# Altium footprint library Mi Libreria.PcbLib: 184 footprints (part 9 of 12)
Each footprint in its own frame and in the unit in brackets; x right, y up, seen from the top. Pads: shape width x height; smd on the part's side, far side on the other; paste and mask are expansions set on the pad; w line width, h text height; cw(c..) or ccw(c..) is an arc to the next point about the centre after c.
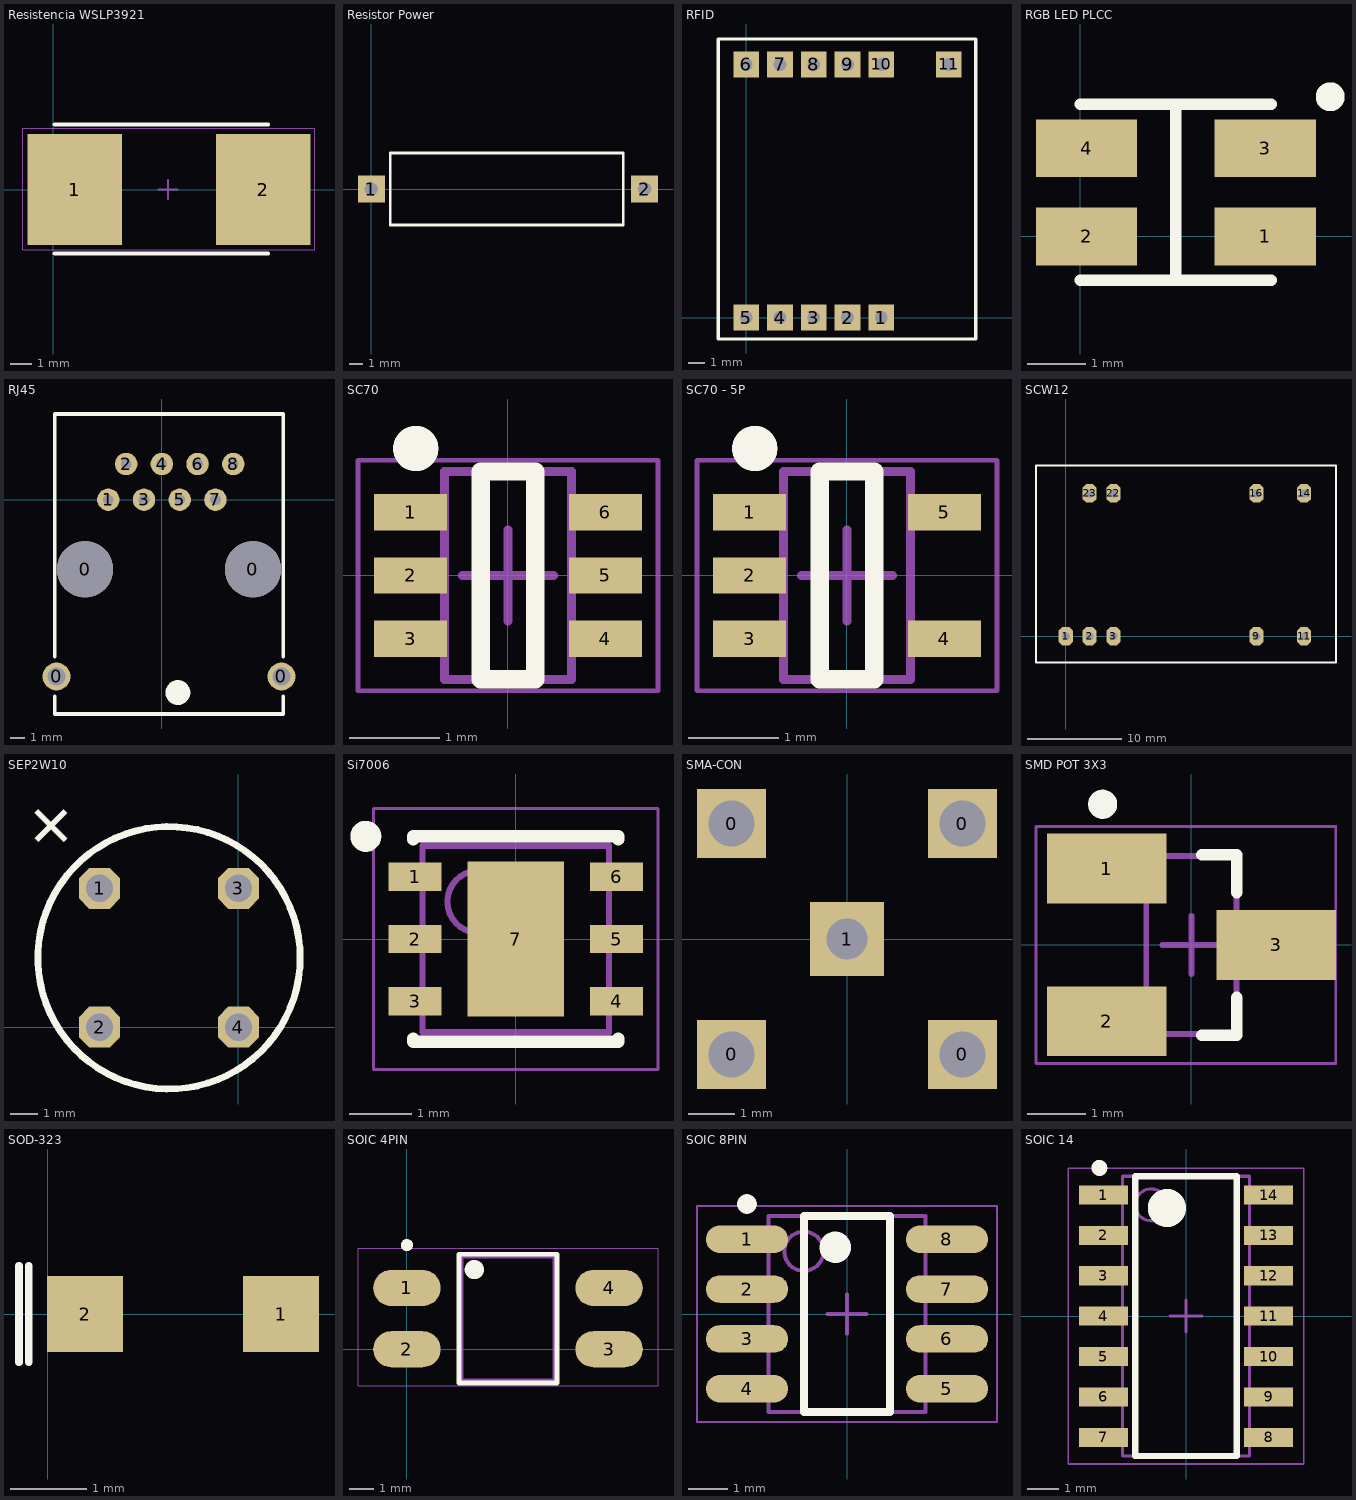
[diagram p8: the footprints below, top view; thin cyan lines are the x and y axes]

## Resistencia WSLP3921 [mm] "SMW510RJT WSLP39213L000FEB"
pads (2):
  rect 4.5x5.3 smd: 1(1.016,0) 2(10,0)
Top Overlay:
  lines w0.2: 0.064,-3.048 10.223,-3.048 ; 0.068,3.102 10.228,3.102
Mechanical 15:
  lines w0.05: -1.46,-2.857 -1.46,2.921 12.446,2.921 12.446,-2.857 -1.46,-2.857
  lines w0.1: 5.011,0 5.911,0 ; 5.461,-0.45 5.461,0.45
3D body "WSLP3921 (0.001).step": height 0.88, standoff 0, extent 0.461,-2.603 10.461,2.596

## Resistor Power [mm] "R 3W 0.6 In."
pads (2):
  rect 2x2 hole 1: 1(0,0) 2(20.25,0)
Top Overlay:
  lines w0.2: 1.397,-2.667 1.397,2.667 18.669,2.667 18.669,-2.667 1.397,-2.667
3D body "3wResistor.STEP": height 5.5, standoff -3.58, extent -0.508,-2.5 20.612,2.5

## RFID [mil] "RFID INNOVATIONS"
pads (11):
  rect 60x60 hole 30: 1(314.96,0) 2(236.22,0) 3(157.48,0) 4(78.74,0) 5(0,0) 6(0,590.55) 7(78.74,590.55) 8(157.48,590.55) 9(236.22,590.55) 10(314.96,590.55) 11(472.44,590.55)
Top Overlay:
  lines w7.87: -65,-50 -65,650 535,650 535,-50 -65,-50
3D body: height 196.85, standoff 78.74, extent -55,-40 525,640

## RGB LED PLCC [mm] "LEd RGB Plcc"
pads (4):
  rect 1.75x1 smd: 1(3.195,0) 2(0.107,0) 3(3.195,1.524) 4(0.107,1.524)
Top Overlay:
  circle w0.3: c4.318,2.413 r0.1
  lines w0.2: 0,-0.762 3.302,-0.762 ; 0,2.286 3.302,2.286 ; 1.651,-0.762 1.651,2.286
3D body "Osram Led PLCC4.step": height 1.95, standoff 0, extent -0.099,-0.638 3.401,2.162

## RJ45 [mm] "Conector"
pads (12):
  round 2 hole 1.25: 0(-7.493,-12.573) 0(8.509,-12.573)
  round 4 hole 4: 0(-5.461,-4.953) 0(6.477,-4.953)
  round 1.6 hole 0.762: 1(-3.81,0) 2(-2.54,2.54) 3(-1.27,0) 4(0,2.54) 5(1.27,0) 6(2.54,2.54) 7(3.81,0) 8(5.08,2.54)
Top Overlay:
  circle w1: c1.143,-13.716 r0.381
  lines w0.254: -7.62,-13.97 -7.62,-15.24 8.636,-15.24 8.636,-13.97 ; -7.62,-11.176 -7.62,6.096 8.636,6.096 8.636,-11.176

## SC70 [mm] "6 Pin SMD SC70"
height 1.1
pads (6):
  rect 0.8x0.4 smd: 1(-1.073,0.696) 2(-1.073,0) 3(-1.073,-0.696) 4(1.073,-0.696) 5(1.073,0) 6(1.073,0.696)
Top Overlay:
  circle w0.25: c-1.016,1.397 r0.125
  lines w0.2: -0.3,-1.143 -0.3,1.143 0.3,1.143 0.3,-1.143 -0.3,-1.143
Mechanical 13:
  lines w0.1: -0.7,-1.143 0.7,-1.143 0.7,1.143 -0.7,1.143 -0.7,-1.143
Mechanical 15:
  lines w0.05: -1.651,-1.27 1.651,-1.27 1.651,1.27 -1.651,1.27 -1.651,-1.27
  lines w0.1: -0.5,0 0.5,0 ; 0,-0.5 0,0.5
3D body "SC70-6.step": height 0.92, standoff -0.03, extent -1.05,-1 1.05,1

## SC70 - 5P [mm] "5 Pin SMD SC70"
height 1.1
pads (5):
  rect 0.8x0.4 smd: 1(-1.073,0.696) 2(-1.073,0) 3(-1.073,-0.696) 4(1.073,-0.696) 5(1.073,0.696)
Top Overlay:
  circle w0.25: c-1.016,1.397 r0.125
  lines w0.2: -0.3,-1.143 0.3,-1.143 0.3,1.143 -0.3,1.143 -0.3,-1.143
Mechanical 13:
  lines w0.1: -0.7,-1.143 -0.7,1.143 0.7,1.143 0.7,-1.143 -0.7,-1.143
Mechanical 15:
  lines w0.05: -1.651,-1.27 -1.651,1.27 1.651,1.27 1.651,-1.27 -1.651,-1.27
  lines w0.1: -0.5,0 0.5,0 ; 0,-0.5 0,0.5
3D body "SC70-5.step": height 1, standoff 0, extent -1.15,-1.05 1.15,1.05

## SCW12 [mm] "DC-DC CONVERTER"
pads (9):
  oct 1.5x2 hole 0.85: 1(0,0) 2(2.54,0) 3(5.08,0) 9(20.34,0) 11(25.42,0) 14(25.42,15.24) 16(20.34,15.24) 22(5.08,15.24) 23(2.54,15.24)
Top Overlay:
  lines w0.2: -3.175,-2.794 28.825,-2.794 28.825,18.206 -3.175,18.206 -3.175,-2.794
3D body: height 15, standoff 0.5, extent -3.048,-2.603 28.575,18.034
3D body: height 3, standoff -2, extent -0.299,-0.367 0.298,0.231
3D body: height 3, standoff -2, extent 2.243,-0.299 2.84,0.3
3D body: height 3, standoff -2, extent 4.783,-0.299 5.38,0.3
3D body: height 3, standoff -2, extent 2.243,14.941 2.84,15.54
3D body: height 3, standoff -2, extent 4.783,14.941 5.38,15.54
3D body: height 3, standoff -2, extent 25.123,-0.299 25.72,0.3
3D body: height 3, standoff -2, extent 20.043,-0.299 20.64,0.3
3D body: height 3, standoff -2, extent 20.043,14.941 20.64,15.54
3D body: height 3, standoff -2, extent 25.123,14.941 25.72,15.54

## SEP2W10 [mm] "Bridge Rectifier"
pads (4):
  oct 1.5x1.5 hole 1: 1(-5.08,5.08) 2(-5.08,0) 3(0,5.08) 4(0,0)
Top Overlay:
  circle w0.254: c-2.54,2.54 r4.8
  text "+" at -6.604,5.715 h3
3D body "SEP2W10.step": height 6.6, standoff -2.5, extent -7.19,-2.11 2.11,7.19

## Si7006 [mm] "Sensor I2C Humedad Temp"
height 1
pads (7):
  rect 0.85x0.455 smd: 1(-1.62,1) 2(-1.62,0) 3(-1.62,-1) 4(1.62,-1) 5(1.62,0) 6(1.62,1)
  rect 1.55x2.5 smd: 7(0,0)
Top Overlay:
  circle w0.25: c-2.413,1.651 r0.125
  lines w0.2: -1.65,-1.6 -1.65,-1.65 1.65,-1.65 1.65,-1.6 ; -1.65,1.6 -1.65,1.65 1.65,1.65 1.65,1.6
Mechanical 13:
  circle w0.1: c-0.6,0.6 r0.5
  lines w0.1: -1.5,-1.5 1.5,-1.5 1.5,1.5 -1.5,1.5 -1.5,-1.5
Mechanical 15:
  lines w0.05: -2.286,-2.1 2.286,-2.1 2.286,2.1 -2.286,2.1 -2.286,-2.1
  lines w0.1: -0.5,0 0.5,0 ; 0,-0.5 0,0.5
3D body: height 1, standoff 0.01, extent -1.5,-1.5 1.5,1.5

## SMA-CON [mm] "ANTENA"
pads (5):
  rect 1.5x1.5 hole 1 square: 0(-2.504,-2.504) 0(-2.504,2.504) 0(2.504,-2.504) 0(2.504,2.504)
  rect 1.6x1.6 hole 0.9: 1(0,0)
3D body "SMA CON.STEP": height 9.6, standoff -3.87, extent -3.175,-3.175 3.175,3.175

## SMD POT 3X3 [mm] "POTENCIOMETRO SMD 3X3mm"
height 1.45
pads (3):
  rect 2.05x1.2 smd: 1(-1.454,1.308) 2(-1.454,-1.308) 3(1.454,0)
Top Overlay:
  circle w0.25: c-1.524,2.413 r0.125
  lines w0.2: 0.175,-1.55 0.775,-1.55 0.775,-0.9 ; 0.175,1.55 0.775,1.55 0.775,0.9
Mechanical 13:
  lines w0.1: -0.775,-1.525 0.775,-1.525 0.775,1.525 -0.775,1.525 -0.775,-1.525
Mechanical 15:
  lines w0.05: -2.667,-2.032 2.475,-2.032 2.475,2.032 -2.667,2.032 -2.667,-2.032
  lines w0.1: -0.5,0 0.5,0 ; 0,-0.5 0,0.5
3D body "POT3X3.stp": height 1.01, standoff -0.06, extent -2.103,-1.9 2.127,1.9

## SOD-323 [mm] "SO3-323 SMD"
pads (2):
  rect 1x1 smd: 1(3.068,0) 2(0.488,0)
Top Overlay:
  lines w0.1: -0.381,-0.635 -0.381,0.635 ; -0.254,-0.635 -0.254,0.635
3D body "SOD-323.STEP": height 1.1, standoff 0, extent 0.478,-0.675 3.078,0.675

## SOIC 4PIN [mm] "SOIC, 4-Leads, Body 5.00x4.00mm, Pitch 1.27mm, IPC Medium Density"
height 2
pads (4):
  oval 2.8x1.5 smd: 1(0,2.54) 2(0,0) 3(8.382,0) 4(8.382,2.54)
Top Overlay:
  circle w0.4: c2.794,3.302 r0.2
  circle w0.25: c0,4.318 r0.125
  lines w0.2: 2.159,-1.397 6.223,-1.397 6.223,3.937 2.159,3.937 2.159,-1.397
Mechanical 13:
  lines w0.1: 2.286,-1.27 6.096,-1.27 6.096,3.81 2.286,3.81 2.286,-1.27
Mechanical 15:
  lines w0.05: -2.032,-1.524 10.414,-1.524 10.414,4.191 -2.032,4.191 -2.032,-1.524
  lines w0.1: -0.5,0 0.5,0 ; 0,-0.5 0,0.5
3D body "SOP 4.step": height 3.85, standoff 0.03, extent -0.736,-1.02 9.144,3.56

## SOIC 8PIN [mm] "SOIC, 8-Leads, Body 5.00x4.00mm, Pitch 1.27mm, IPC Medium Density"
height 2
pads (8):
  oval 2.1x0.7 smd: 1(-2.55,1.905) 2(-2.55,0.635) 3(-2.55,-0.635) 4(-2.55,-1.905) 5(2.55,-1.905) 6(2.55,-0.635) 7(2.55,0.635) 8(2.55,1.905)
Top Overlay:
  circle w0.25: c-2.55,2.805 r0.125
  circle w0.4: c-0.3,1.7 r0.2
  lines w0.2: -1.1,-2.5 -1.1,2.5 1.1,2.5 1.1,-2.5 -1.1,-2.5
Mechanical 13:
  circle w0.1: c-1.1,1.6 r0.5
  lines w0.1: -2,-2.5 -2,2.5 2,2.5 2,-2.5 -2,-2.5
Mechanical 15:
  lines w0.05: -3.825,-2.75 -3.825,2.75 3.825,2.75 3.825,-2.75 -3.825,-2.75
  lines w0.1: -0.5,0 0.5,0 ; 0,-0.5 0,0.5
3D body "SOIC-8.step": height 1.6, standoff 0, extent -2.995,-2.45 2.995,2.45

## SOIC 14 [mm] "SOIC, 14-Leads, Body 8.65x3.90mm, Pitch 1.27mm, IPC Medium Density"
height 1.75
pads (14):
  rect 1.55x0.6 smd: 1(-2.598,3.81) 2(-2.598,2.54) 3(-2.598,1.27) 4(-2.598,0) 5(-2.598,-1.27) 6(-2.598,-2.54) 7(-2.598,-3.81) 8(2.598,-3.81) 9(2.598,-2.54) 10(2.598,-1.27) 11(2.598,0) 12(2.598,1.27) 13(2.598,2.54) 14(2.598,3.81)
Top Overlay:
  circle w0.6: c-0.6,3.4 r0.3
  circle w0.25: c-2.725,4.66 r0.125
  lines w0.2: -1.6,-4.4 1.6,-4.4 1.6,4.4 -1.6,4.4 -1.6,-4.4
Mechanical 13:
  circle w0.1: c-1.1,3.5 r0.5
  lines w0.1: -2,-4.4 2,-4.4 2,4.4 -2,4.4 -2,-4.4
Mechanical 15:
  lines w0.05: -3.7,-4.65 3.7,-4.65 3.7,4.65 -3.7,4.65 -3.7,-4.65
  lines w0.1: -0.5,0 0.5,0 ; 0,-0.5 0,0.5
3D body "SOIC 14.step": height 1.75, standoff 0, extent -3,-4.4 3,4.4